# Altium schematic symbol library Schlib.SchLib: 725 symbols (part 2 of 6) (continued)
## ERA-2ARB911X
designator R?  value 910Ω  Tolerance: 0.1%  (hidden comment: *)
Res Thin Film 0402 910 Ohm 0.1% 0.063W(1/16W) ±10ppm/C Pad SMD T/R Automotive AEC-Q200; Manufacturer: Panasonic; Manufacturer Part Number: ERA-2ARB911X; Manufacturer Lifecycle Status: ACTIVE; Part Series: Thin Film Chip Resistors, High Reliability Type; Max Power Dissipation: 63mW; Temperature Coefficient: 10ppm/°C; Voltage Rating: 50V; Supplier: Arrow Electronics; Supplier Part Number: ERA-2ARB911X; RoHS: Compliant; Category: Chip SMD Resistors; Stock: 5586; Pricing: 1712=0.0575 (USD); Case/Package: 0402; Case Code (Imperial): 0402; Case Code (Metric): 1005; Composition: Thin Film; Features: Automotive AEC-Q200; Height: 350µm; Lead Free: Lead Free; Length: 990.6µm; Lifecycle Status: Production; Max Operating Temperature: 155°C; Min Operating Temperature: -55°C; Mounting Technology: Surface Mount; Number of Terminals: 2; Number of Terminations: 2; Packaging: Cut Tape; Power Dissipation: 63mW; Power Rating: 63mW; REACH SVHC: Yes; Schedule B: 8533210045, 8533210045|8533210045|8533210045|8533210045|8533210045; Voltage Rating (DC): 50V; Width: 500µm; Working Voltage: 50V; ComponentLink1URL: https://datasheet.octopart.com:443/ERA-2ARB911X-Panasonic-datasheet-62287448.pdf?src-supplier=Panasonic; ComponentLink1Description: https://datasheet.octopart.com:443/ERA-2ARB911X-Panasonic-datasheet-62287448.pdf?src-supplier=Panasonic; ComponentLink2URL: https://datasheet.octopart.com:443/ERA-2ARB911X-Panasonic-datasheet-46744048.pdf?src-supplier=Newark; ComponentLink2Description: https://datasheet.octopart.com:443/ERA-2ARB911X-Panasonic-datasheet-46744048.pdf?src-supplier=Newark; ComponentLink3URL: https://sigma.octopart.com:443/150570796/technical_drawing/Panasonic-ERA2ARB911X.pdf?src-supplier=Panasonic+SCT; ComponentLink3Description: https://sigma.octopart.com:443/150570796/technical_drawing/Panasonic-ERA2ARB911X.pdf?src-supplier=Panasonic+SCT; ComponentLink4URL: https://datasheet.octopart.com:443/ERA2ARB911X-Panasonic-datasheet-136531316.pdf?src-supplier=Farnell; ComponentLink4Description: https://datasheet.octopart.com:443/ERA2ARB911X-Panasonic-datasheet-136531316.pdf?src-supplier=Farnell; ComponentLink5URL: https://datasheet.octopart.com/ERA-2ARB911X-Panasonic-datasheet-78375410.pdf; ComponentLink5Description: https://datasheet.octopart.com/ERA-2ARB911X-Panasonic-datasheet-78375410.pdf
footprint R 0402 (1005 Metric) (Chip Capacitor, Body 1.0x0.5mm, IPC High Density)
pins: 1 B, 2 A

## ERA-2ARB2101X
designator R?  value 2.1kR  Tolerance: 0.1%  (hidden comment: *)
0402 Thin Film Chip Resistor / 0402 SMD Resistor 0.1% 10PPM 2.1 Kohm; Manufacturer: Panasonic; Manufacturer Part Number: ERA-2ARB2101X; Max Power Dissipation: 63mW; Temperature Coefficient: 10ppm/°C; Supplier: Mouser; Supplier Part Number: 667-ERA-2ARB2101X; RoHS: Yes; Category: Chip SMD Resistors; Stock: 1261; Pricing: 1=0.73, 10=0.518, 50=0.396, 100=0.351, 1000=0.229, 10000=0.22 (USD); Case/Package: 0402; Case Code (Metric): 1005; Case Code (Imperial): 0402; Min Operating Temperature: -55°C; Max Operating Temperature: 155°C; Packaging: Cut Tape; Number of Terminations: 2; Features: Automotive AEC-Q200; Series: ERA-2A; Length: 0.039inch; Width: 0.02inch; Height: 0.016inch; Lead Free: Lead Free; ComponentLink1URL: https://media.digikey.com/pdf/Data%20Sheets/Panasonic%20Resistors%20Thermistors%20PDFs/ERA_Series_LE.pdf?src-supplier=Digikey; ComponentLink1Description: https://media.digikey.com/pdf/Data%20Sheets/Panasonic%20Resistors%20Thermistors%20PDFs/ERA_Series_LE.pdf?src-supplier=Digikey; ComponentLink2URL: https://industrial.panasonic.com/cdbs/www-data/pdf/RDM0000/AOA0000C307.pdf?src-supplier=Digikey; ComponentLink2Description: https://industrial.panasonic.com/cdbs/www-data/pdf/RDM0000/AOA0000C307.pdf?src-supplier=Digikey
footprint R 0402 (1005 Metric) (Chip Capacitor, Body 1.0x0.5mm, IPC High Density)
pins: 1 B, 2 A

## ERA-2ARB2211X
designator R?  value 2.21kR  Tolerance: 0.1%  (hidden comment: *)
0402 Thin Film Chip Resistor / 0402 SMD Resistor 0.1% 10PPM 2.21 Kohm; Manufacturer: Panasonic; Manufacturer Part Number: ERA-2ARB2211X; Max Power Dissipation: 63mW; Temperature Coefficient: 10ppm/°C; Supplier: Mouser; Supplier Part Number: 667-ERA-2ARB2211X; RoHS: Yes; Category: Chip SMD Resistors; Stock: 8077; Pricing: 1=0.73, 10=0.518, 50=0.396, 100=0.351, 1000=0.229, 10000=0.22 (USD); Case/Package: 0402; Case Code (Metric): 1005; Case Code (Imperial): 0402; Min Operating Temperature: -55°C; Max Operating Temperature: 155°C; Packaging: Cut Tape; Number of Terminations: 2; Features: Automotive AEC-Q200; Series: ERA-2A; Length: 0.039inch; Width: 0.02inch; Height: 0.016inch; Lead Free: Lead Free; ComponentLink1URL: https://industrial.panasonic.com/cdbs/www-data/pdf/RDM0000/AOA0000C307.pdf?src-supplier=Digikey; ComponentLink1Description: https://industrial.panasonic.com/cdbs/www-data/pdf/RDM0000/AOA0000C307.pdf?src-supplier=Digikey
footprint R 0402 (1005 Metric) (Chip Capacitor, Body 1.0x0.5mm, IPC High Density)
pins: 1 B, 2 A

## ERA-2ARB2212X
designator R?  value 22.1kR  (hidden comment: *)
0402 Thin Film Chip Resistor / 0402 SMD Resistor 0.1% 10PPM 22.1 Kohm; Manufacturer: Panasonic; Manufacturer Part Number: ERA-2ARB2212X; Max Power Dissipation: 63mW; Temperature Coefficient: 10ppm/°C; Supplier: Digi-Key; Supplier Part Number: P17980CT-ND; RoHS: Yes; Category: Chip SMD Resistors; Stock: 9769; Pricing: 1=0.81000, 10=0.67800, 100=0.45510, 500=0.32922, 1000=0.26628, 2500=0.25757, 5000=0.25176 (USD); Case/Package: 0402; Case Code (Metric): 1005; Case Code (Imperial): 0402; Min Operating Temperature: -55°C; Max Operating Temperature: 155°C; Features: Automotive AEC-Q200; Packaging: Tape and Reel; Resistor Type: Thin Film; Number of Terminations: 2; Tolerance: 0.1%; Length: 0.039inch; Width: 0.02inch; Height: 0.016inch; Lead Free: Lead Free; ComponentLink1URL: https://media.digikey.com/pdf/Data%20Sheets/Panasonic%20Resistors%20Thermistors%20PDFs/ERA_Series_LE.pdf?src-supplier=Digi-Key; ComponentLink1Description: https://media.digikey.com/pdf/Data%20Sheets/Panasonic%20Resistors%20Thermistors%20PDFs/ERA_Series_LE.pdf?src-supplier=Digi-Key
footprint R 0402 (1005 Metric) (Chip Capacitor, Body 1.0x0.5mm, IPC High Density)
pins: 1 B, 2 A

## ERA-2ARB5761X
designator R?  value 5.76kR  Tolerance: 0.1%  (hidden comment: *)
0402 Thin Film Chip Resistor / 0402 SMD Resistor 0.1% 10PPM 5.76 Kohm; Manufacturer: Panasonic; Manufacturer Part Number: ERA-2ARB5761X; Max Power Dissipation: 63mW; Temperature Coefficient: 10ppm/°C; Supplier: Mouser; Supplier Part Number: 667-ERA-2ARB5761X; RoHS: Yes; Category: Chip SMD Resistors; Stock: 9675; Pricing: 1=0.73, 10=0.518, 50=0.397, 100=0.351, 1000=0.229, 10000=0.22 (USD); Case/Package: 0402; Case Code (Metric): 1005; Case Code (Imperial): 0402; Min Operating Temperature: -55°C; Max Operating Temperature: 155°C; Packaging: Cut Tape; Number of Terminations: 2; Features: Automotive AEC-Q200; Series: ERA-2A; Length: 0.039inch; Width: 0.02inch; Height: 0.016inch; Lead Free: Lead Free; ComponentLink1URL: https://industrial.panasonic.com/cdbs/www-data/pdf/RDM0000/AOA0000C307.pdf?src-supplier=Digikey; ComponentLink1Description: https://industrial.panasonic.com/cdbs/www-data/pdf/RDM0000/AOA0000C307.pdf?src-supplier=Digikey
footprint R 0402 (1005 Metric) (Chip Capacitor, Body 1.0x0.5mm, IPC High Density)
pins: 1 B, 2 A

## ERA-2VEB1201X
designator R?  value 1.2kΩ  (hidden comment: *)
Fixed Resistor, Thin Film, 0.1W, 1200ohm, 75V, 0.1% +/-Tol, 25ppm/Cel, Surface Mount, 0402; Manufacturer: Panasonic; Manufacturer Part Number: ERA-2VEB1201X; Manufacturer Lifecycle Status: ACTIVE; Part Series: Thin Film Chip Resistors, High Stability and Reliability Type; Power Dissipation: 100mW; Temperature Coefficient: 25ppm/°C; Supplier: Arrow Electronics; Supplier Part Number: ERA-2VEB1201X; RoHS: Compliant; Category: Chip SMD Resistors; Stock: 7393; Pricing: 1=0.019, 10=0.018, 25=0.018, 100=0.018, 250=0.018, 500=0.017, 1000=0.017, 3000=0.017, 6000=0.017 (USD); Height: 350µm; Lifecycle Status: Production; Max Operating Temperature: 155°C; Min Operating Temperature: -55°C; Mounting Technology: Surface Mount; Number of Terminals: 2; REACH SVHC: Yes; Schedule B: 8533210045, 8533210045|8533210045, 8533210045|8533210045|8533210045, 8533210045|8533210045|8533210045|8533210045; Tolerance: 0.1%; Width: 500µm; Working Voltage: 75V; ComponentLink1URL: https://datasheet.octopart.com:443/ERA-2VEB1201X-Panasonic-datasheet-150570798.pdf?src-supplier=Panasonic; ComponentLink1Description: https://datasheet.octopart.com:443/ERA-2VEB1201X-Panasonic-datasheet-150570798.pdf?src-supplier=Panasonic; ComponentLink2URL: https://datasheet.octopart.com:443/ERA-2VEB1201X-Panasonic-datasheet-170668886.pdf?src-supplier=Newark; ComponentLink2Description: https://datasheet.octopart.com:443/ERA-2VEB1201X-Panasonic-datasheet-170668886.pdf?src-supplier=Newark; ComponentLink3URL: https://datasheet.octopart.com:443/ERA-2VEB1201X-Panasonic-datasheet-184398013.pdf?src-supplier=Master+Electronics; ComponentLink3Description: https://datasheet.octopart.com:443/ERA-2VEB1201X-Panasonic-datasheet-184398013.pdf?src-supplier=Master+Electronics; ComponentLink4URL: https://sigma.octopart.com:443/150570796/technical_drawing/Panasonic-ERA2VEB1201X.pdf?src-supplier=Panasonic+SCT; ComponentLink4Description: https://sigma.octopart.com:443/150570796/technical_drawing/Panasonic-ERA2VEB1201X.pdf?src-supplier=Panasonic+SCT
footprint R 0402 (1005 Metric) (Chip Capacitor, Body 1.0x0.5mm, IPC High Density)
pins: 1 B, 2 A

## ERB-RD2R00X
designator Fuse?  (value not drawn)
Fuse Chip Fast Acting 2A 32V SMD Solder Pad 0402 1 X 0.5 X 0.39mm T/R UL/cUL; Manufacturer: Panasonic; Manufacturer Part Number: ERB-RD2R00X; Manufacturer Lifecycle Status: ACTIVE; Part Series: Micro Chip Fuse; Approvals: UL; Body Material: Alumina; Value: 53mΩ; Supplier: RS; Supplier Part Number: 7594751P; RoHS: Compliant; Category: Fuses; Stock: 1804; Pricing: 10=0.16 (GBP); Case/Package: 0402; Case Code (Imperial): 0402; Case Code (Metric): 1005; Current: 2A; Current Rating: 2A; Depth: 500µm; Fuse Current: 2A; Height: 390µm; Length: 1mm; Lifecycle Status: Production; Max Operating Temperature: 125°C; Max Voltage Rating (DC): 32V; Min Operating Temperature: -40°C; Mounting Technology: Surface Mount; Pins: 2; Packaging: Cut Tape; Radiation Hardening: No; REACH SVHC: Yes; Voltage Rating: 32V; Voltage Rating (DC): 32V; Width: 500µm; ComponentLink1URL: https://datasheet.octopart.com:443/ERB-RD2R00X-Panasonic-datasheet-78834729.pdf?src-supplier=Panasonic; ComponentLink1Description: https://datasheet.octopart.com:443/ERB-RD2R00X-Panasonic-datasheet-78834729.pdf?src-supplier=Panasonic; ComponentLink2URL: https://datasheet.octopart.com:443/ERB-RD2R00X-Panasonic-datasheet-11844109.pdf?src-supplier=RS+(Formerly+Allied+Electronics); ComponentLink2Description: https://datasheet.octopart.com:443/ERB-RD2R00X-Panasonic-datasheet-11844109.pdf?src-supplier=RS+(Formerly+Allied+Electronics); ComponentLink3URL: https://datasheet.octopart.com:443/ERB-RD2R00X-Panasonic-datasheet-136807619.pdf?src-supplier=Farnell; ComponentLink3Description: https://datasheet.octopart.com:443/ERB-RD2R00X-Panasonic-datasheet-136807619.pdf?src-supplier=Farnell; ComponentLink4URL: https://datasheet.octopart.com:443/ERB-RD2R00X-Panasonic-datasheet-10129016.pdf?src-supplier=Newark; ComponentLink4Description: https://datasheet.octopart.com:443/ERB-RD2R00X-Panasonic-datasheet-10129016.pdf?src-supplier=Newark
footprint FUSC0402X49N
pins: 1, 2

## ERJ-1GNF1332C
designator R?  value 13.3kR  (hidden comment: *)
Res Thick Film 0201 13.3K Ohm 1% 0.05W ±200ppm/°C Molded SMD T/R; Manufacturer: Panasonic; Manufacturer Part Number: ERJ-1GNF1332C; Power Rating: 50mW; Voltage Rating: 25V; Supplier: Mouser; Supplier Part Number: 667-ERJ-1GNF1332C; RoHS: Yes; Category: Chip SMD Resistors; Stock: 79067; Pricing: 1=0.1, 10=0.053, 50=0.053, 100=0.021, 1000=0.009, 10000=0.006 (USD); Mounting Technology: Surface Mount; Case/Package: 0201; Case Code (Imperial): 0201; Case Code (Metric): 0603; Contact Plating: Tin,Matte; Weight: 6E-06oz; Min Operating Temperature: -55°C; Max Operating Temperature: 125°C; Tolerance: 1%; Packaging: Tape and Reel; Package Quantity: 15000; Termination: SMD/SMT; Number of Terminations: 2; Temperature Coefficient: 200ppm/°C; Max Power Dissipation: 50mW; Features: Automotive AEC-Q200; Series: ERJ; Length: 0.024inch; Width: 0.3mm; Height: 0.01inch; Radiation Hardening: No; ComponentLink1URL: https://datasheet.ciiva.com/24186/aoa0000ce2-24186827.pdf?src-supplier=Mouser; ComponentLink1Description: https://datasheet.ciiva.com/24186/aoa0000ce2-24186827.pdf?src-supplier=Mouser
footprint R 0201 (0603 Metric)
pins: 1 B, 2 A

## ERJ-1GNF4701C
designator R?  value 4.7kR  (hidden comment: *)
SMD Chip Resistor, 4.7 kOhm, ï¿½ 1%, 50 mW, 0201 [0603 Metric], Thick Film, General Purpose; Manufacturer: Panasonic; Manufacturer Part Number: ERJ-1GNF4701C; Power Rating: 50mW; Voltage Rating: 25V; Temperature Coefficient: 200ppm/°C; Supplier: Rs; Supplier Part Number: 1797160; RoHS: Yes; Category: Chip SMD Resistors; Stock: 2000; Pricing: 1000=0.009, 5000=0.008, 10000=0.007 (EUR); Mounting Technology: Surface Mount; Case/Package: 0201; Pins: 2; Case Code (Imperial): 0201; Case Code (Metric): 0603; Contact Plating: Tin,Matte; Min Operating Temperature: -55°C; Max Operating Temperature: 125°C; Tolerance: 1%; Packaging: Tape and Reel; Package Quantity: 15000; Resistor Type: Thick Film; Number of Terminations: 2; Max Power Dissipation: 50mW; Working Voltage: 25V; Series: ERJ; Resistance Tolerance: 1%; Technology: THICK FILM; Features: Automotive AEC-Q200; Voltage Rating (DC): 25V; Length: 0.024inch; Width: 0.3mm; Height: 0.01inch; Ratings: AEC-Q200; RoHS Compliant: Yes; Reach SVHC Compliant: Unknown; Lead Free: 5697LeadFree; ComponentLink1URL: https://datasheet.ciiva.com/7830/1678782-7830714.pdf?src-supplier=Element14; ComponentLink1Description: https://datasheet.ciiva.com/7830/1678782-7830714.pdf?src-supplier=Element14; ComponentLink2URL: https://datasheet.ciiva.com/43467/1678782-43467070.pdf?src-supplier=Farnell; ComponentLink2Description: https://datasheet.ciiva.com/43467/1678782-43467070.pdf?src-supplier=Farnell; ComponentLink3URL: https://datasheet.ciiva.com/46375/1678782-46375115.pdf?src-supplier=Element14; ComponentLink3Description: https://datasheet.ciiva.com/46375/1678782-46375115.pdf?src-supplier=Element14; ComponentLink4URL: https://datasheet.ciiva.com/22743/1678782-22743082.pdf?src-supplier=Element14; ComponentLink4Description: https://datasheet.ciiva.com/22743/1678782-22743082.pdf?src-supplier=Element14; ComponentLink5URL: https://datasheet.ciiva.com/22743/1678782-22743083.pdf?src-supplier=Element14; ComponentLink5Description: https://datasheet.ciiva.com/22743/1678782-22743083.pdf?src-supplier=Element14; ComponentLink6URL: https://datasheet.ciiva.com/16201/aoa0000ce2-16201382.pdf?src-supplier=Future+Electronics; ComponentLink6Description: https://datasheet.ciiva.com/16201/aoa0000ce2-16201382.pdf?src-supplier=Future+Electronics
footprint R 0201 (0603 Metric)
pins: 1 B, 2 A

## ERJ-2BWFR050X
designator R?  value 50mR  (hidden comment: *)
SMD Current Sense Resistor, 50 Milliohm, ± 1%, 250 mW, 0402 [1005 Metric], Thick Film; Manufacturer: Panasonic; Manufacturer Part Number: ERJ-2BWFR050X; Max Power Dissipation: 250mW; Temperature Coefficient: 300ppm/°C; Supplier: Mouser; Supplier Part Number: 667-ERJ-2BWFR050X; RoHS: Yes; Category: Chip SMD Resistors; Stock: 134978; Pricing: 1=0.39, 10=0.17, 50=0.17, 100=0.092, 1000=0.07, 10000=0.058 (USD); Case/Package: 0402; Case Code (Metric): 1005; Case Code (Imperial): 0402; Min Operating Temperature: -55°C; Max Operating Temperature: 155°C; Packaging: Cut Tape; Number of Terminations: 2; Tolerance: 1%; Features: Automotive AEC-Q200; Series: ERJ; Length: 0.039inch; Width: 0.02inch; Height: 0.016inch; ComponentLink1URL: http://www.farnell.com/datasheets/2197344.pdf?src-supplier=Farnell; ComponentLink1Description: http://www.farnell.com/datasheets/2197344.pdf?src-supplier=Farnell; ComponentLink2URL: http://www.mouser.com/ds/2/315/AOA0000C295-1109214.pdf?src-supplier=Mouser; ComponentLink2Description: http://www.mouser.com/ds/2/315/AOA0000C295-1109214.pdf?src-supplier=Mouser; ComponentLink3URL: https://datasheet.octopart.com/ERJ-2BWFR050X-Panasonic-datasheet-68299093.pdf?src-supplier=Future+Electronics; ComponentLink3Description: https://datasheet.octopart.com/ERJ-2BWFR050X-Panasonic-datasheet-68299093.pdf?src-supplier=Future+Electronics; ComponentLink4URL: https://datasheet.octopart.com/ERJ-2BWFR050X-Panasonic-datasheet-136473239.pdf?src-supplier=Farnell; ComponentLink4Description: https://datasheet.octopart.com/ERJ-2BWFR050X-Panasonic-datasheet-136473239.pdf?src-supplier=Farnell; ComponentLink5URL: http://datasheet.octopart.com/ERJ-2BWFR050X-Panasonic-datasheet-68299093.pdf?src-supplier=Onlinecomponents.com; ComponentLink5Description: http://datasheet.octopart.com/ERJ-2BWFR050X-Panasonic-datasheet-68299093.pdf?src-supplier=Onlinecomponents.com; ComponentLink6URL: http://datasheet.octopart.com/ERJ-2BWFR050X-Panasonic-datasheet-68299093.pdf?src-supplier=Electro+Sonic; ComponentLink6Description: http://datasheet.octopart.com/ERJ-2BWFR050X-Panasonic-datasheet-68299093.pdf?src-supplier=Electro+Sonic; ComponentLink7URL: https://datasheet.octopart.com/ERJ-2BWFR050X-Panasonic-datasheet-78386601.pdf?src-supplier=Master+Electronics; ComponentLink7Description: https://datasheet.octopart.com/ERJ-2BWFR050X-Panasonic-datasheet-78386601.pdf?src-supplier=Master+Electronics
footprint R 0402 (1005 Metric) (Chip Capacitor, Body 1.0x0.5mm, IPC High Density)
pins: 1 B, 2 A

## ERJ-2GE0R00X
designator R?  value 0mR  (hidden comment: *)
SMD Chip Resistor, Jumper, 0 ohm, 100 mW, 0402 [1005 Metric], Thick Film, General Purpose; Manufacturer: Panasonic; Manufacturer Part Number: ERJ-2GE0R00X; Power Rating: 100mW; Voltage Rating: 50V; Tolerance: 5%; Temperature Coefficient: 600ppm/°C; Supplier: Digi-Key; Supplier Part Number: P0.0JCT-ND; RoHS: Yes; Category: Chip SMD Resistors; Stock: 12419974; Pricing: 1=0.10000, 10=0.02700, 25=0.02000, 50=0.01500, 100=0.01110, 250=0.00848, 500=0.00680, 1000=0.00500, 5000=0.00359 (USD); Mounting Technology: Surface Mount; Case/Package: 0402; Contact Plating: Tin; Case Code (Metric): 1005; Case Code (Imperial): 0402; Min Operating Temperature: -55°C; Max Operating Temperature: 155°C; Resistor Type: Thick Film; Packaging: Cut Tape; Package Quantity: 10000; Number of Terminations: 2; Termination: SMD/SMT; Max Power Dissipation: 100mW; Voltage Rating (DC): 50V; Features: Automotive AEC-Q200; Series: ERJ; Construction: Rectangular; Technology: THICK FILM; Length: 1mm; Width: 0.5mm; Height: 0.35mm; Depth: 0.5mm; Ratings: AEC-Q200; Radiation Hardening: No; Reach SVHC Compliant: Yes; Military Standard: Not; Lead Free: Lead Free; RoHS Compliant: Yes; ComponentLink1URL: https://datasheet.ciiva.com/11821/0900766b80f806dd-11821176.pdf?src-supplier=Rs; ComponentLink1Description: https://datasheet.ciiva.com/11821/0900766b80f806dd-11821176.pdf?src-supplier=Rs; ComponentLink2URL: https://datasheet.ciiva.com/43460/1678796-43460347.pdf?src-supplier=Farnell; ComponentLink2Description: https://datasheet.ciiva.com/43460/1678796-43460347.pdf?src-supplier=Farnell; ComponentLink3URL: https://datasheet.ciiva.com/46389/1678796-46389518.pdf?src-supplier=Element14; ComponentLink3Description: https://datasheet.ciiva.com/46389/1678796-46389518.pdf?src-supplier=Element14; ComponentLink4URL: https://datasheet.ciiva.com/5959/1678796-5959692.pdf?src-supplier=Farnell; ComponentLink4Description: https://datasheet.ciiva.com/5959/1678796-5959692.pdf?src-supplier=Farnell; ComponentLink5URL: https://datasheet.ciiva.com/28695/1678796-28695758.pdf?src-supplier=Element14; ComponentLink5Description: https://datasheet.ciiva.com/28695/1678796-28695758.pdf?src-supplier=Element14; ComponentLink6URL: https://datasheet.ciiva.com/16783/70260739-16783734.pdf?src-supplier=Allied+Electronics; ComponentLink6Description: https://datasheet.ciiva.com/16783/70260739-16783734.pdf?src-supplier=Allied+Electronics; ComponentLink7URL: https://datasheet.ciiva.com/16778/70260739-16778335.pdf?src-supplier=Allied+Electronics; ComponentLink7Description: https://datasheet.ciiva.com/16778/70260739-16778335.pdf?src-supplier=Allied+Electronics; ComponentLink8URL: https://datasheet.ciiva.com/48531/aoa0000ce1-48531077.pdf?src-supplier=Avnet; ComponentLink8Description: https://datasheet.ciiva.com/48531/aoa0000ce1-48531077.pdf?src-supplier=Avnet; ComponentLink9URL: https://datasheet.ciiva.com/30097/4aoa0000ce1-30097116.pdf?src-supplier=Onlinecomponents.com; ComponentLink9Description: https://datasheet.ciiva.com/30097/4aoa0000ce1-30097116.pdf?src-supplier=Onlinecomponents.com
footprint R 0402 (1005 Metric) (Chip Capacitor, Body 1.0x0.5mm, IPC High Density)
pins: 1 B, 2 A

## ERJ-2GEJ1R0X
designator R?  value 1R  (hidden comment: *)
Res Thick Film 0402 1 Ohm 5% 1/10W -100ppm/¦¦; Manufacturer: Panasonic; Manufacturer Part Number: ERJ-2GEJ1R0X; Power Rating: 100mW; Voltage Rating: 50V; Temperature Coefficient: 600ppm/°C; Supplier: Digi-Key; Supplier Part Number: P1.0JCT-ND; RoHS: Yes; Category: Chip SMD Resistors; Stock: 337721; Pricing: 1=0.10000, 10=0.02900, 100=0.01180, 1000=0.00532, 2500=0.00461, 5000=0.00381 (USD); Mounting Technology: Surface Mount; Case/Package: 0402; Case Code (Imperial): 0402; Case Code (Metric): 1005; Contact Plating: Tin; Min Operating Temperature: -55°C; Max Operating Temperature: 155°C; Tolerance: 5%; Packaging: Tape and Reel; Resistor Type: Thick Film; Package Quantity: 1; Termination: SMD/SMT; Number of Terminations: 2; Max Power Dissipation: 100mW; Voltage Rating (DC): 50V; Features: Automotive AEC-Q200; Series: ERJ; Construction: Rectangular; Technology: THICK FILM; Resistance Tolerance: 5%; Length: 1mm; Width: 0.5mm; Height: 0.35mm; Depth: 0.5mm; Ratings: AEC-Q200; Radiation Hardening: No; Reach SVHC Compliant: Yes; Military Standard: Not; Lead Free: Lead Free; RoHS Compliant: Yes; ComponentLink1URL: https://datasheet.ciiva.com/34303/1986844-34303545.pdf?src-supplier=Jameco; ComponentLink1Description: https://datasheet.ciiva.com/34303/1986844-34303545.pdf?src-supplier=Jameco; ComponentLink2URL: https://datasheet.ciiva.com/43460/1500035-43460348.pdf?src-supplier=Farnell; ComponentLink2Description: https://datasheet.ciiva.com/43460/1500035-43460348.pdf?src-supplier=Farnell; ComponentLink3URL: https://datasheet.ciiva.com/28547/1678796-28547147.pdf?src-supplier=Element14; ComponentLink3Description: https://datasheet.ciiva.com/28547/1678796-28547147.pdf?src-supplier=Element14; ComponentLink4URL: https://datasheet.ciiva.com/24068/aoa0000ce1-37422-24068837.pdf?src-supplier=Mouser; ComponentLink4Description: https://datasheet.ciiva.com/24068/aoa0000ce1-37422-24068837.pdf?src-supplier=Mouser; ComponentLink5URL: https://datasheet.ciiva.com/16758/70260739-16758282.pdf?src-supplier=Allied+Electronics; ComponentLink5Description: https://datasheet.ciiva.com/16758/70260739-16758282.pdf?src-supplier=Allied+Electronics; ComponentLink6URL: https://datasheet.ciiva.com/9198/aoa0000ce1-9198901.pdf?src-supplier=Avnet; ComponentLink6Description: https://datasheet.ciiva.com/9198/aoa0000ce1-9198901.pdf?src-supplier=Avnet; ComponentLink7URL: https://datasheet.ciiva.com/48530/aoa0000ce1-48530951.pdf?src-supplier=Avnet; ComponentLink7Description: https://datasheet.ciiva.com/48530/aoa0000ce1-48530951.pdf?src-supplier=Avnet; ComponentLink8URL: https://datasheet.ciiva.com/30245/4aoa0000ce1-30245805.pdf?src-supplier=Onlinecomponents.com; ComponentLink8Description: https://datasheet.ciiva.com/30245/4aoa0000ce1-30245805.pdf?src-supplier=Onlinecomponents.com; ComponentLink9URL: https://datasheet.ciiva.com/46389/1500035-46389755.pdf?src-supplier=Element14; ComponentLink9Description: https://datasheet.ciiva.com/46389/1500035-46389755.pdf?src-supplier=Element14; ComponentLink10URL: https://datasheet.ciiva.com/6138/1500035-6138734.pdf?src-supplier=Farnell; ComponentLink10Description: https://datasheet.ciiva.com/6138/1500035-6138734.pdf?src-supplier=Farnell; ComponentLink11URL: https://datasheet.ciiva.com/46377/1500035-46377671.pdf?src-supplier=Element14; ComponentLink11Description: https://datasheet.ciiva.com/46377/1500035-46377671.pdf?src-supplier=Element14; ComponentLink12URL: https://datasheet.ciiva.com/16772/70260739-16772860.pdf?src-supplier=Allied+Electronics; ComponentLink12Description: https://datasheet.ciiva.com/16772/70260739-16772860.pdf?src-supplier=Allied+Electronics; Pins: 2; Weight: 0.000388oz; ComponentLink13URL: https://datasheet.ciiva.com/34303/1987038-34303550.pdf?src-supplier=Jameco; ComponentLink13Description: https://datasheet.ciiva.com/34303/1987038-34303550.pdf?src-supplier=Jameco; ComponentLink14URL: https://datasheet.ciiva.com/11821/0900766b80f80784-11821175.pdf?src-supplier=Rs; ComponentLink14Description: https://datasheet.ciiva.com/11821/0900766b80f80784-11821175.pdf?src-supplier=Rs; ComponentLink15URL: https://datasheet.ciiva.com/7830/aoa0000ce2-7830725.pdf?src-supplier=Element14; ComponentLink15Description: https://datasheet.ciiva.com/7830/aoa0000ce2-7830725.pdf?src-supplier=Element14; ComponentLink16URL: https://datasheet.ciiva.com/7830/426256-7830974.pdf?src-supplier=Element14; ComponentLink16Description: https://datasheet.ciiva.com/7830/426256-7830974.pdf?src-supplier=Element14; ComponentLink17URL: https://datasheet.ciiva.com/43467/1678782-43467480.pdf?src-supplier=Farnell; ComponentLink17Description: https://datasheet.ciiva.com/43467/1678782-43467480.pdf?src-supplier=Farnell; ComponentLink18URL: https://datasheet.ciiva.com/22723/426256-22723902.pdf?src-supplier=Element14; ComponentLink18Description: https://datasheet.ciiva.com/22723/426256-22723902.pdf?src-supplier=Element14; ComponentLink19URL: https://datasheet.ciiva.com/16778/70260748-16778055.pdf?src-supplier=Allied+Electronics; ComponentLink19Description: https://datasheet.ciiva.com/16778/70260748-16778055.pdf?src-supplier=Allied+Electronics; ComponentLink20URL: https://datasheet.ciiva.com/16784/70260748-16784190.pdf?src-supplier=Allied+Electronics; ComponentLink20Description: https://datasheet.ciiva.com/16784/70260748-16784190.pdf?src-supplier=Allied+Electronics; ComponentLink21URL: https://datasheet.ciiva.com/9186/aoa0000ce2-9186687.pdf?src-supplier=Avnet; ComponentLink21Description: https://datasheet.ciiva.com/9186/aoa0000ce2-9186687.pdf?src-supplier=Avnet; ComponentLink22URL: https://datasheet.ciiva.com/16440/aoa0000ce2-16440217.pdf?src-supplier=Future+Electronics; ComponentLink22Description: https://datasheet.ciiva.com/16440/aoa0000ce2-16440217.pdf?src-supplier=Future+Electronics; ComponentLink23URL: https://datasheet.ciiva.com/48531/aoa0000ce2-48531070.pdf?src-supplier=Avnet; ComponentLink23Description: https://datasheet.ciiva.com/48531/aoa0000ce2-48531070.pdf?src-supplier=Avnet; ComponentLink24URL: https://datasheet.ciiva.com/30245/aoa0000ce2-30245691.pdf?src-supplier=Onlinecomponents.com; ComponentLink24Description: https://datasheet.ciiva.com/30245/aoa0000ce2-30245691.pdf?src-supplier=Onlinecomponents.com
footprint R 0402 (1005 Metric) (Chip Capacitor, Body 1.0x0.5mm, IPC High Density)
pins: 1 B, 2 A

## ERJ-2GEJ103X
designator R?  value 10kR  (hidden comment: *)
Res Thick Film 0402 10K Ohm 5% 1/10W ±200ppm/°C Molded SMD Punched Carrier T/R; Manufacturer: Panasonic; Manufacturer Part Number: ERJ-2GEJ103X; Power Rating: 100mW; Voltage Rating: 50V; Supplier: Digi-Key; Supplier Part Number: P10KJCT-ND; RoHS: Yes; Category: Chip SMD Resistors; Stock: 10562994; Pricing: 1=0.10000, 10=0.02900, 100=0.01180, 1000=0.00532, 2500=0.00461, 5000=0.00381 (USD); Mounting Technology: Surface Mount; Case/Package: 0402; Contact Plating: Tin; Case Code (Metric): 1005; Case Code (Imperial): 0402; Min Operating Temperature: -55°C; Max Operating Temperature: 155°C; Tolerance: 5%; Temperature Coefficient: 200ppm/°C; Packaging: Cut Tape; Resistor Type: Thick Film; Package Quantity: 10000; Number of Terminations: 2; Termination: SMD/SMT; Max Power Dissipation: 100mW; Voltage Rating (DC): 50V; Features: Automotive AEC-Q200; Series: ERJ; Construction: Rectangular; Resistance Tolerance: 5%; Technology: THICK FILM; Length: 1mm; Width: 0.5mm; Height: 0.35mm; Depth: 0.5mm; Ratings: AEC-Q200; Radiation Hardening: No; Reach SVHC Compliant: Yes; Military Standard: Not; Lead Free: Lead Free; RoHS Compliant: Yes; ComponentLink1URL: https://datasheet.ciiva.com/27055/1935721-27055112.pdf?src-supplier=Jameco; ComponentLink1Description: https://datasheet.ciiva.com/27055/1935721-27055112.pdf?src-supplier=Jameco; ComponentLink2URL: https://datasheet.ciiva.com/11821/0900766b80f806dd-11821170.pdf?src-supplier=Rs; ComponentLink2Description: https://datasheet.ciiva.com/11821/0900766b80f806dd-11821170.pdf?src-supplier=Rs; ComponentLink3URL: https://datasheet.ciiva.com/24070/aoa0000ce1-37422-24070679.pdf?src-supplier=Mouser; ComponentLink3Description: https://datasheet.ciiva.com/24070/aoa0000ce1-37422-24070679.pdf?src-supplier=Mouser; ComponentLink4URL: https://datasheet.ciiva.com/16767/70260739-16767130.pdf?src-supplier=Allied+Electronics; ComponentLink4Description: https://datasheet.ciiva.com/16767/70260739-16767130.pdf?src-supplier=Allied+Electronics; ComponentLink5URL: https://datasheet.ciiva.com/9194/aoa0000ce1-9194140.pdf?src-supplier=Avnet; ComponentLink5Description: https://datasheet.ciiva.com/9194/aoa0000ce1-9194140.pdf?src-supplier=Avnet; ComponentLink6URL: https://datasheet.ciiva.com/43460/1678796-43460391.pdf?src-supplier=Farnell; ComponentLink6Description: https://datasheet.ciiva.com/43460/1678796-43460391.pdf?src-supplier=Farnell; ComponentLink7URL: https://datasheet.ciiva.com/22785/1678796-22785949.pdf?src-supplier=Farnell; ComponentLink7Description: https://datasheet.ciiva.com/22785/1678796-22785949.pdf?src-supplier=Farnell; ComponentLink8URL: https://datasheet.ciiva.com/46371/1678796-46371910.pdf?src-supplier=Element14; ComponentLink8Description: https://datasheet.ciiva.com/46371/1678796-46371910.pdf?src-supplier=Element14; ComponentLink9URL: https://datasheet.ciiva.com/28514/1678796-28514154.pdf?src-supplier=Element14; ComponentLink9Description: https://datasheet.ciiva.com/28514/1678796-28514154.pdf?src-supplier=Element14; ComponentLink10URL: https://datasheet.ciiva.com/16774/70260739-16774504.pdf?src-supplier=Allied+Electronics; ComponentLink10Description: https://datasheet.ciiva.com/16774/70260739-16774504.pdf?src-supplier=Allied+Electronics; ComponentLink11URL: https://datasheet.ciiva.com/48531/aoa0000ce1-48531082.pdf?src-supplier=Avnet; ComponentLink11Description: https://datasheet.ciiva.com/48531/aoa0000ce1-48531082.pdf?src-supplier=Avnet
footprint R 0402 (1005 Metric) (Chip Capacitor, Body 1.0x0.5mm, IPC High Density)
pins: 1 B, 2 A

## ERJ-2RKF10R0X
designator R?  value 10R  (hidden comment: *)
Res Thick Film 0402 10 Ohm 1% 1/10W ±100ppm/°C Molded SMD Punched Carrier T/R; Manufacturer: Panasonic; Manufacturer Part Number: ERJ-2RKF10R0X; Power Rating: 100mW; Voltage Rating: 50V; Supplier: Mouser; Supplier Part Number: 667-ERJ-2RKF10R0X; RoHS: Yes; Category: Chip SMD Resistors; Stock: 1740684; Pricing: 1=0.1, 10=0.017, 50=0.017, 100=0.008, 1000=0.006, 10000=0.004 (USD); Case Code (Imperial): 0402; Case Code (Metric): 1005; Weight: 0.000388oz; Min Operating Temperature: -55°C; Max Operating Temperature: 155°C; Tolerance: 1%; Packaging: Cut Tape; Package Quantity: 10000; Termination: SMD/SMT; Temperature Coefficient: 100ppm/°C; Voltage Rating (DC): 50V; Series: ERJ-2Rx; Technology: THICK FILM; Length: 1mm; Width: 0.5mm; Height: 0.35mm; Lead Free: Lead Free; RoHS Compliant: Yes; ComponentLink1URL: https://datasheet.ciiva.com/11821/0900766b80f80784-11821168.pdf?src-supplier=Rs; ComponentLink1Description: https://datasheet.ciiva.com/11821/0900766b80f80784-11821168.pdf?src-supplier=Rs; ComponentLink2URL: https://datasheet.ciiva.com/6082/aoa0000ce2-6082046.pdf?src-supplier=Farnell; ComponentLink2Description: https://datasheet.ciiva.com/6082/aoa0000ce2-6082046.pdf?src-supplier=Farnell; ComponentLink3URL: https://datasheet.ciiva.com/43467/1678782-43467127.pdf?src-supplier=Farnell; ComponentLink3Description: https://datasheet.ciiva.com/43467/1678782-43467127.pdf?src-supplier=Farnell; ComponentLink4URL: https://datasheet.ciiva.com/7802/aoa0000ce2-7802405.pdf?src-supplier=Element14; ComponentLink4Description: https://datasheet.ciiva.com/7802/aoa0000ce2-7802405.pdf?src-supplier=Element14; ComponentLink5URL: https://datasheet.ciiva.com/27055/1987054-27055644.pdf?src-supplier=Jameco; ComponentLink5Description: https://datasheet.ciiva.com/27055/1987054-27055644.pdf?src-supplier=Jameco; ComponentLink6URL: https://datasheet.ciiva.com/22668/1678782-22668302.pdf?src-supplier=Element14; ComponentLink6Description: https://datasheet.ciiva.com/22668/1678782-22668302.pdf?src-supplier=Element14; ComponentLink7URL: https://datasheet.ciiva.com/24071/aoa0000ce2-24071514.pdf?src-supplier=Mouser; ComponentLink7Description: https://datasheet.ciiva.com/24071/aoa0000ce2-24071514.pdf?src-supplier=Mouser; ComponentLink8URL: https://datasheet.ciiva.com/16773/70260748-16773366.pdf?src-supplier=Allied+Electronics; ComponentLink8Description: https://datasheet.ciiva.com/16773/70260748-16773366.pdf?src-supplier=Allied+Electronics; ComponentLink9URL: https://datasheet.ciiva.com/9194/aoa0000ce2-9194120.pdf?src-supplier=Avnet; ComponentLink9Description: https://datasheet.ciiva.com/9194/aoa0000ce2-9194120.pdf?src-supplier=Avnet; ComponentLink10URL: https://datasheet.ciiva.com/30218/aoa0000ce2-30218536.pdf?src-supplier=Onlinecomponents.com; ComponentLink10Description: https://datasheet.ciiva.com/30218/aoa0000ce2-30218536.pdf?src-supplier=Onlinecomponents.com; Case/Package: 0402
footprint R 0402 (1005 Metric) (Chip Capacitor, Body 1.0x0.5mm, IPC High Density)
pins: 1 B, 2 A

## ERJ-2RKF30R0X
designator R?  value 30R  (hidden comment: *)
SMD Chip Resistor, 30 Ohm, ± 1%, 100 mW, 0402 [1005 Metric], Thick Film, Precision; Manufacturer: Panasonic; Manufacturer Part Number: ERJ-2RKF30R0X; Supplier: Mouser; Supplier Part Number: 667-ERJ-2RKF30R0X; RoHS: Yes; Category: Chip SMD Resistors; Stock: 90884; Pricing: 1=0.1, 10=0.03, 50=0.03, 100=0.012, 1000=0.006, 10000=0.003 (USD); ComponentLink1URL: https://datasheet.ciiva.com/11821/0900766b80f80784-11821259.pdf?src-supplier=Rs; ComponentLink1Description: https://datasheet.ciiva.com/11821/0900766b80f80784-11821259.pdf?src-supplier=Rs; ComponentLink2URL: https://datasheet.ciiva.com/24071/aoa0000ce2-24071997.pdf?src-supplier=Mouser; ComponentLink2Description: https://datasheet.ciiva.com/24071/aoa0000ce2-24071997.pdf?src-supplier=Mouser; ComponentLink3URL: https://datasheet.ciiva.com/46373/1678782-46373478.pdf?src-supplier=Element14; ComponentLink3Description: https://datasheet.ciiva.com/46373/1678782-46373478.pdf?src-supplier=Element14; ComponentLink4URL: https://datasheet.ciiva.com/46373/1678782-46373479.pdf?src-supplier=Element14; ComponentLink4Description: https://datasheet.ciiva.com/46373/1678782-46373479.pdf?src-supplier=Element14; ComponentLink5URL: https://datasheet.ciiva.com/16781/70260748-16781229.pdf?src-supplier=Allied+Electronics; ComponentLink5Description: https://datasheet.ciiva.com/16781/70260748-16781229.pdf?src-supplier=Allied+Electronics; ComponentLink6URL: https://datasheet.ciiva.com/9190/aoa0000ce2-9190855.pdf?src-supplier=Avnet; ComponentLink6Description: https://datasheet.ciiva.com/9190/aoa0000ce2-9190855.pdf?src-supplier=Avnet; ComponentLink7URL: https://datasheet.ciiva.com/30104/aoa0000ce2-30104910.pdf?src-supplier=Onlinecomponents.com; ComponentLink7Description: https://datasheet.ciiva.com/30104/aoa0000ce2-30104910.pdf?src-supplier=Onlinecomponents.com; ComponentLink8URL: https://datasheet.ciiva.com/7795/1678782-7795526.pdf?src-supplier=Element14; ComponentLink8Description: https://datasheet.ciiva.com/7795/1678782-7795526.pdf?src-supplier=Element14; Case/Package: 0402
footprint R 0402 (1005 Metric) (Chip Capacitor, Body 1.0x0.5mm, IPC High Density)
pins: 1 B, 2 A

## ERJ-2RKF33R0X
designator R?  value 33R  (hidden comment: *)
Res Thick Film 0402 33 Ohm 1% 0.1W ±100ppm/°C Molded SMD Punched Carrier T/R; Manufacturer: Panasonic; Manufacturer Part Number: ERJ-2RKF33R0X; Power Rating: 100mW; Voltage Rating: 50V; Supplier: Farnell; Supplier Part Number: 2302472; RoHS: Yes; Category: Chip SMD Resistors; Stock: 43314; Pricing: 10=0.0171, 100=0.0102, 500=0.0086, 2500=0.0061, 5000=0.006 (EUR); Mounting Technology: Surface Mount; Case/Package: 0402; Pins: 2; Contact Plating: Tin; Case Code (Metric): 1005; Case Code (Imperial): 0402; Min Operating Temperature: -55°C; Max Operating Temperature: 155°C; Tolerance: 1%; Resistor Type: Thick Film; Temperature Coefficient: 100ppm/°C; Packaging: Tape and Reel; Package Quantity: 1; Number of Terminations: 2; Termination: SMD/SMT; Max Power Dissipation: 100mW; Features: Automotive AEC-Q200; Series: ERJ; Resistance Tolerance: 1%; Technology: THICK FILM; Construction: Rectangular; Voltage Rating (DC): 50V; Length: 1mm; Width: 0.5mm; Height: 0.35mm; Depth: 0.5mm; Reach SVHC Compliant: No; Military Standard: Not; RoHS Compliant: Yes; Lead Free: 5697LeadFree; ComponentLink1URL: https://datasheet.ciiva.com/11821/0900766b80f80784-11821292.pdf?src-supplier=Rs; ComponentLink1Description: https://datasheet.ciiva.com/11821/0900766b80f80784-11821292.pdf?src-supplier=Rs; ComponentLink2URL: https://datasheet.ciiva.com/5917/aoa0000ce2-5917817.pdf?src-supplier=Farnell; ComponentLink2Description: https://datasheet.ciiva.com/5917/aoa0000ce2-5917817.pdf?src-supplier=Farnell; ComponentLink3URL: https://datasheet.ciiva.com/7836/aoa0000ce2-7836490.pdf?src-supplier=Element14; ComponentLink3Description: https://datasheet.ciiva.com/7836/aoa0000ce2-7836490.pdf?src-supplier=Element14; ComponentLink4URL: https://datasheet.ciiva.com/7836/426256-7836813.pdf?src-supplier=Element14; ComponentLink4Description: https://datasheet.ciiva.com/7836/426256-7836813.pdf?src-supplier=Element14; ComponentLink5URL: https://datasheet.ciiva.com/43467/1678782-43467173.pdf?src-supplier=Farnell; ComponentLink5Description: https://datasheet.ciiva.com/43467/1678782-43467173.pdf?src-supplier=Farnell; ComponentLink6URL: https://datasheet.ciiva.com/46373/1678782-46373081.pdf?src-supplier=Element14; ComponentLink6Description: https://datasheet.ciiva.com/46373/1678782-46373081.pdf?src-supplier=Element14; ComponentLink7URL: https://datasheet.ciiva.com/46373/1678782-46373082.pdf?src-supplier=Element14; ComponentLink7Description: https://datasheet.ciiva.com/46373/1678782-46373082.pdf?src-supplier=Element14; ComponentLink8URL: https://datasheet.ciiva.com/24023/aoa0000ce2-24023999.pdf?src-supplier=Mouser; ComponentLink8Description: https://datasheet.ciiva.com/24023/aoa0000ce2-24023999.pdf?src-supplier=Mouser; ComponentLink9URL: https://datasheet.ciiva.com/16777/70260748-16777705.pdf?src-supplier=Allied+Electronics; ComponentLink9Description: https://datasheet.ciiva.com/16777/70260748-16777705.pdf?src-supplier=Allied+Electronics; ComponentLink10URL: https://datasheet.ciiva.com/9190/aoa0000ce2-9190507.pdf?src-supplier=Avnet; ComponentLink10Description: https://datasheet.ciiva.com/9190/aoa0000ce2-9190507.pdf?src-supplier=Avnet
footprint R 0402 (1005 Metric) (Chip Capacitor, Body 1.0x0.5mm, IPC High Density)
pins: 1 B, 2 A

## ERJ-2RKF60R4X
designator R?  value 60.4R  (hidden comment: *)
SMD Chip Resistor, 60.4 Ohm, ± 1%, 100 mW, 0402 [1005 Metric], Thick Film, Precision; Manufacturer: Panasonic; Manufacturer Part Number: ERJ-2RKF60R4X; Voltage Rating (DC): 50V; Supplier: Mouser; Supplier Part Number: 667-ERJ-2RKF60R4X; RoHS: Yes; Category: Chip SMD Resistors; Stock: 159308; Pricing: 1=0.1, 10=0.016, 50=0.016, 100=0.009, 1000=0.007, 10000=0.004 (USD); Lead Free: 5698LeadFree; ComponentLink1URL: https://datasheet.ciiva.com/46373/1678782-46373448.pdf?src-supplier=Element14; ComponentLink1Description: https://datasheet.ciiva.com/46373/1678782-46373448.pdf?src-supplier=Element14; ComponentLink2URL: https://datasheet.ciiva.com/46373/1678782-46373449.pdf?src-supplier=Element14; ComponentLink2Description: https://datasheet.ciiva.com/46373/1678782-46373449.pdf?src-supplier=Element14; ComponentLink3URL: https://datasheet.ciiva.com/16777/70260748-16777353.pdf?src-supplier=Allied+Electronics; ComponentLink3Description: https://datasheet.ciiva.com/16777/70260748-16777353.pdf?src-supplier=Allied+Electronics; ComponentLink4URL: https://datasheet.ciiva.com/16783/70260748-16783483.pdf?src-supplier=Allied+Electronics; ComponentLink4Description: https://datasheet.ciiva.com/16783/70260748-16783483.pdf?src-supplier=Allied+Electronics; ComponentLink5URL: https://datasheet.ciiva.com/22674/1678782-22674277.pdf?src-supplier=Element14; ComponentLink5Description: https://datasheet.ciiva.com/22674/1678782-22674277.pdf?src-supplier=Element14; ComponentLink6URL: https://datasheet.ciiva.com/24025/aoa0000ce2-24025947.pdf?src-supplier=Mouser; ComponentLink6Description: https://datasheet.ciiva.com/24025/aoa0000ce2-24025947.pdf?src-supplier=Mouser; ComponentLink7URL: https://datasheet.ciiva.com/7853/aoa0000ce2-7853695.pdf?src-supplier=Element14; ComponentLink7Description: https://datasheet.ciiva.com/7853/aoa0000ce2-7853695.pdf?src-supplier=Element14; ComponentLink8URL: https://datasheet.ciiva.com/9188/aoa0000ce2-9188454.pdf?src-supplier=Avnet; ComponentLink8Description: https://datasheet.ciiva.com/9188/aoa0000ce2-9188454.pdf?src-supplier=Avnet; ComponentLink9URL: https://datasheet.ciiva.com/9188/aoa0000ce2-9188457.pdf?src-supplier=Avnet; ComponentLink9Description: https://datasheet.ciiva.com/9188/aoa0000ce2-9188457.pdf?src-supplier=Avnet; Case/Package: 0402
footprint R 0402 (1005 Metric) (Chip Capacitor, Body 1.0x0.5mm, IPC High Density)
pins: 1 B, 2 A

## ERJ-2RKF75R0X
designator R?  value 75R  (hidden comment: *)
Res Thick Film 0402 75 Ohm 1% 1/10W ±100ppm/°C Molded SMD Punched Carrier T/R; Manufacturer: Panasonic; Manufacturer Part Number: ERJ-2RKF75R0X; Voltage Rating: 50V; Power Rating: 100mW; Supplier: Digi-Key; Supplier Part Number: P75.0LCT-ND; RoHS: Yes; Category: Chip SMD Resistors; Stock: 1027446; Pricing: 1=0.10000, 10=0.03400, 100=0.01390, 1000=0.00625, 2500=0.00543, 5000=0.00448 (USD); Mounting Technology: Surface Mount; Case/Package: 0402; Case Code (Metric): 1005; Case Code (Imperial): 0402; Contact Plating: Tin; Min Operating Temperature: -55°C; Max Operating Temperature: 155°C; Tolerance: 1%; Packaging: Tape and Reel; Package Quantity: 1; Resistor Type: Thick Film; Number of Terminations: 2; Termination: SMD/SMT; Temperature Coefficient: 100ppm/°C; Max Power Dissipation: 100mW; Voltage Rating (DC): 50V; Features: Automotive AEC-Q200; Series: ERJ; Technology: THICK FILM; Resistance Tolerance: 1%; Construction: Rectangular; Length: 1mm; Width: 0.5mm; Height: 0.35mm; Depth: 0.5mm; Radiation Hardening: No; Reach SVHC Compliant: Yes; Military Standard: Not; Lead Free: Lead Free; RoHS Compliant: Yes; ComponentLink1URL: https://datasheet.ciiva.com/11821/0900766b80f80784-11821360.pdf?src-supplier=Rs; ComponentLink1Description: https://datasheet.ciiva.com/11821/0900766b80f80784-11821360.pdf?src-supplier=Rs; ComponentLink2URL: https://datasheet.ciiva.com/43460/426256-43460278.pdf?src-supplier=Farnell; ComponentLink2Description: https://datasheet.ciiva.com/43460/426256-43460278.pdf?src-supplier=Farnell; ComponentLink3URL: https://datasheet.ciiva.com/46388/426256-46388476.pdf?src-supplier=Element14; ComponentLink3Description: https://datasheet.ciiva.com/46388/426256-46388476.pdf?src-supplier=Element14; ComponentLink4URL: https://datasheet.ciiva.com/5917/426256-5917818.pdf?src-supplier=Farnell; ComponentLink4Description: https://datasheet.ciiva.com/5917/426256-5917818.pdf?src-supplier=Farnell; ComponentLink5URL: https://datasheet.ciiva.com/46377/426256-46377007.pdf?src-supplier=Element14; ComponentLink5Description: https://datasheet.ciiva.com/46377/426256-46377007.pdf?src-supplier=Element14; ComponentLink6URL: https://datasheet.ciiva.com/24071/aoa0000ce2-24071598.pdf?src-supplier=Mouser; ComponentLink6Description: https://datasheet.ciiva.com/24071/aoa0000ce2-24071598.pdf?src-supplier=Mouser; ComponentLink7URL: https://datasheet.ciiva.com/16777/70260748-16777802.pdf?src-supplier=Allied+Electronics; ComponentLink7Description: https://datasheet.ciiva.com/16777/70260748-16777802.pdf?src-supplier=Allied+Electronics; ComponentLink8URL: https://datasheet.ciiva.com/16772/70260748-16772175.pdf?src-supplier=Allied+Electronics; ComponentLink8Description: https://datasheet.ciiva.com/16772/70260748-16772175.pdf?src-supplier=Allied+Electronics; ComponentLink9URL: https://datasheet.ciiva.com/9187/aoa0000ce2-9187662.pdf?src-supplier=Avnet; ComponentLink9Description: https://datasheet.ciiva.com/9187/aoa0000ce2-9187662.pdf?src-supplier=Avnet; ComponentLink10URL: https://datasheet.ciiva.com/48531/aoa0000ce2-48531055.pdf?src-supplier=Avnet; ComponentLink10Description: https://datasheet.ciiva.com/48531/aoa0000ce2-48531055.pdf?src-supplier=Avnet; ComponentLink11URL: https://datasheet.ciiva.com/30254/aoa0000ce2-30254694.pdf?src-supplier=Onlinecomponents.com; ComponentLink11Description: https://datasheet.ciiva.com/30254/aoa0000ce2-30254694.pdf?src-supplier=Onlinecomponents.com
footprint R 0402 (1005 Metric) (Chip Capacitor, Body 1.0x0.5mm, IPC High Density)
pins: 1 B, 2 A